# Altium footprint library Package_SO.PcbLib: 333 footprints (part 14 of 21)
Each footprint in its own frame and in the unit in brackets; x right, y up, seen from the top. Pads: shape width x height; smd on the part's side, far side on the other; paste and mask are expansions set on the pad; w line width, h text height; cw(c..) or ccw(c..) is an arc to the next point about the centre after c.
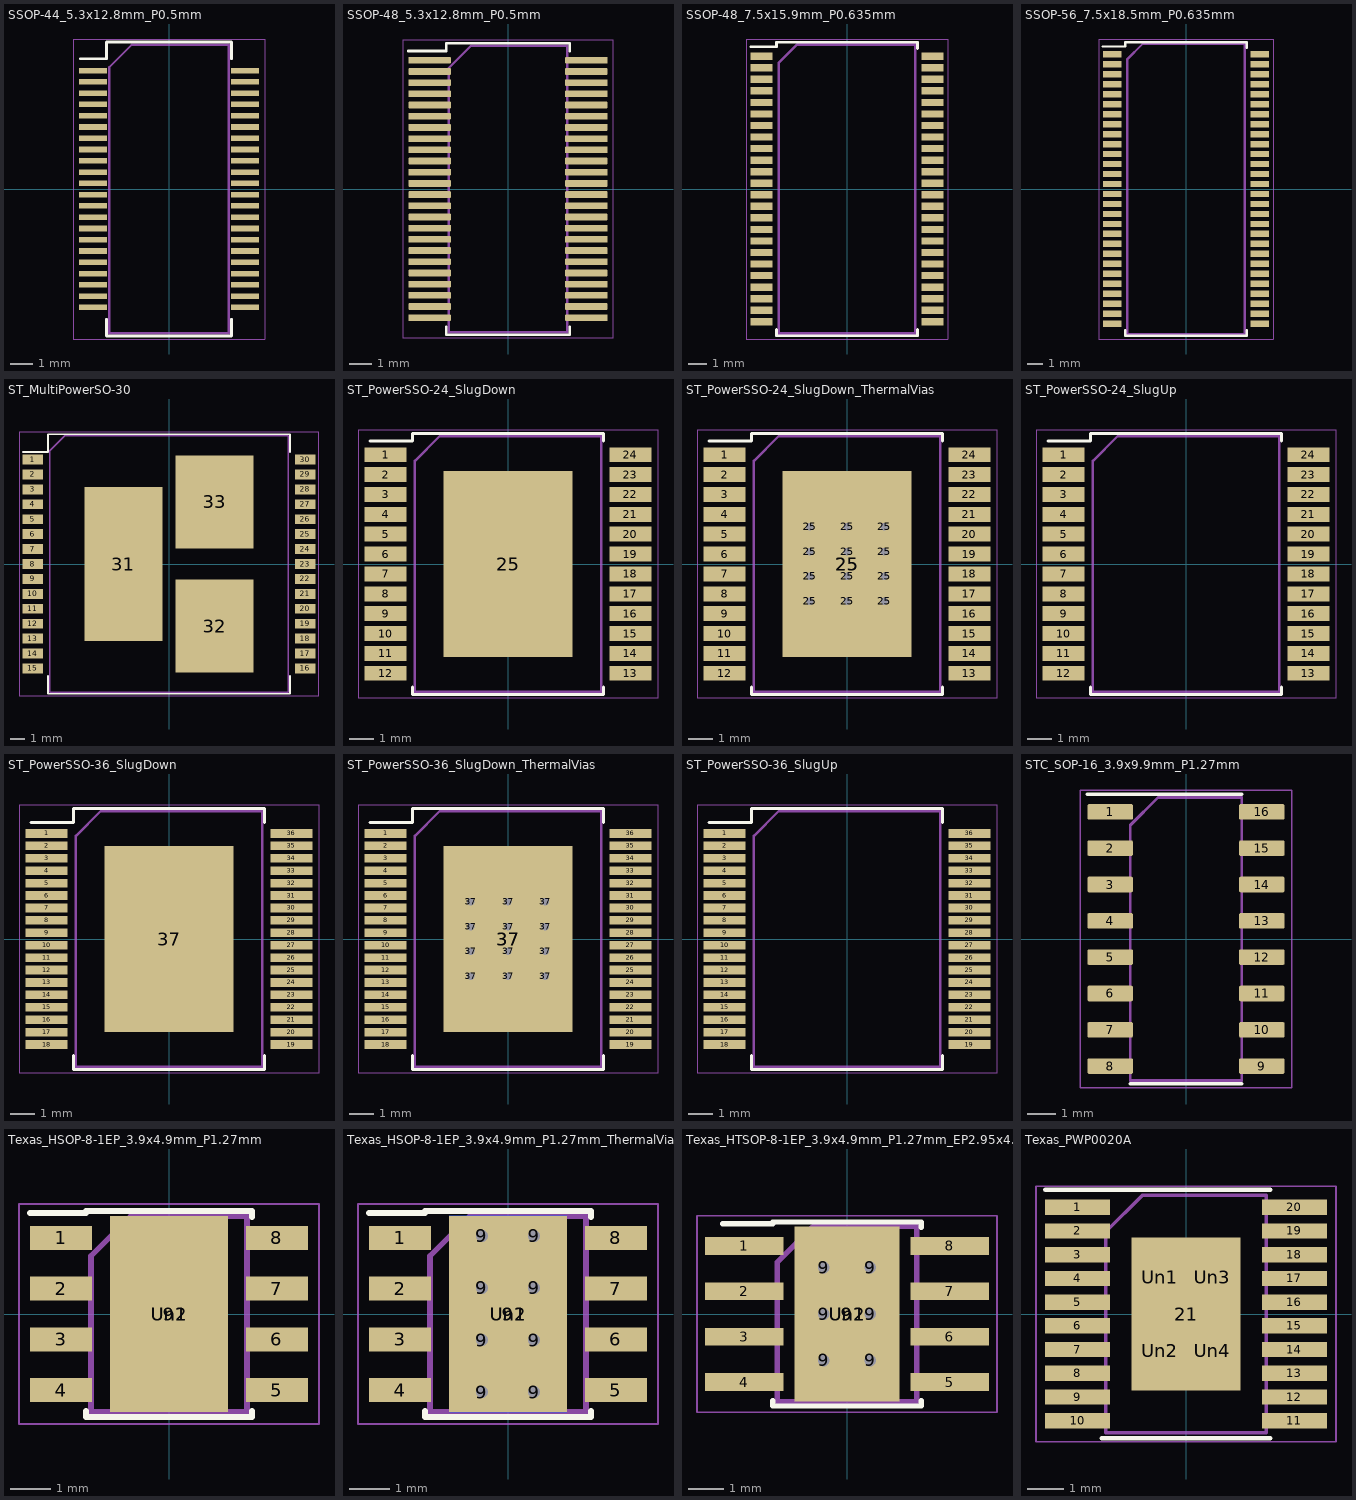
[diagram p13: the footprints below, top view; thin cyan lines are the x and y axes]

## SSOP-44_5.3x12.8mm_P0.5mm [mm]
pads (44):
  rect 1.25x0.25 smd: 1(-3.375,5.25) 2(-3.375,4.75) 3(-3.375,4.25) 4(-3.375,3.75) 5(-3.375,3.25) 6(-3.375,2.75) 7(-3.375,2.25) 8(-3.375,1.75) 9(-3.375,1.25) 10(-3.375,0.75) 11(-3.375,0.25) 12(-3.375,-0.25) 13(-3.375,-0.75) 14(-3.375,-1.25) 15(-3.375,-1.75) 16(-3.375,-2.25) 17(-3.375,-2.75) 18(-3.375,-3.25) 19(-3.375,-3.75) 20(-3.375,-4.25) 21(-3.375,-4.75) 22(-3.375,-5.25) 23(3.375,-5.25) 24(3.375,-4.75) 25(3.375,-4.25) 26(3.375,-3.75) 27(3.375,-3.25) 28(3.375,-2.75) 29(3.375,-2.25) 30(3.375,-1.75) 31(3.375,-1.25) 32(3.375,-0.75) 33(3.375,-0.25) 34(3.375,0.25) 35(3.375,0.75) 36(3.375,1.25) 37(3.375,1.75) 38(3.375,2.25) 39(3.375,2.75) 40(3.375,3.25) 41(3.375,3.75) 42(3.375,4.25) 43(3.375,4.75) 44(3.375,5.25)
F.SilkS:
  lines w0.12: -3.94,5.77 -2.77,5.77 -2.77,6.52 2.77,6.52 2.77,5.77 ; -2.77,-5.77 -2.77,-6.52 2.77,-6.52 2.77,-5.77
F.CrtYd:
  lines w0.05: -4.25,-6.65 -4.25,6.65 4.25,6.65 4.25,-6.65 -4.25,-6.65
F.Fab:
  lines w0.1: -2.65,-6.4 2.65,-6.4 2.65,6.4 -1.65,6.4 -2.65,5.4 -2.65,-6.4
  text "'.Designator'" at -4.047,-0.84 h1

## SSOP-48_5.3x12.8mm_P0.5mm [mm]
pads (48):
  rrect25% 1.9x0.3 smd: 1(-3.5,5.75) 2(-3.5,5.25) 3(-3.5,4.75) 4(-3.5,4.25) 5(-3.5,3.75) 6(-3.5,3.25) 7(-3.5,2.75) 8(-3.5,2.25) 9(-3.5,1.75) 10(-3.5,1.25) 11(-3.5,0.75) 12(-3.5,0.25) 13(-3.5,-0.25) 14(-3.5,-0.75) 15(-3.5,-1.25) 16(-3.5,-1.75) 17(-3.5,-2.25) 18(-3.5,-2.75) 19(-3.5,-3.25) 20(-3.5,-3.75) 21(-3.5,-4.25) 22(-3.5,-4.75) 23(-3.5,-5.25) 24(-3.5,-5.75) 25(3.5,-5.75) 26(3.5,-5.25) 27(3.5,-4.75) 28(3.5,-4.25) 29(3.5,-3.75) 30(3.5,-3.25) 31(3.5,-2.75) 32(3.5,-2.25) 33(3.5,-1.75) 34(3.5,-1.25) 35(3.5,-0.75) 36(3.5,-0.25) 37(3.5,0.25) 38(3.5,0.75) 39(3.5,1.25) 40(3.5,1.75) 41(3.5,2.25) 42(3.5,2.75) 43(3.5,3.25) 44(3.5,3.75) 45(3.5,4.25) 46(3.5,4.75) 47(3.5,5.25) 48(3.5,5.75)
F.SilkS:
  lines w0.12: -4.45,6.16 -2.76,6.16 -2.76,6.51 0,6.51 2.76,6.51 2.76,6.16 ; -2.76,-6.16 -2.76,-6.51 0,-6.51 2.76,-6.51 2.76,-6.16
F.CrtYd:
  lines w0.05: -4.7,-6.65 -4.7,6.65 4.7,6.65 4.7,-6.65 -4.7,-6.65
F.Fab:
  lines w0.1: -2.65,-6.4 -2.65,5.4 -1.65,6.4 2.65,6.4 2.65,-6.4 -2.65,-6.4
  text "'.Designator'" at -4.047,-0.84 h1

## SSOP-48_7.5x15.9mm_P0.635mm [mm]
pads (48):
  rect 1.2x0.4 smd: 1(-4.7,7.302) 2(-4.7,6.667) 3(-4.7,6.032) 4(-4.7,5.397) 5(-4.7,4.763) 6(-4.7,4.127) 7(-4.7,3.492) 8(-4.7,2.857) 9(-4.7,2.222) 10(-4.7,1.587) 11(-4.7,0.953) 12(-4.7,0.318) 13(-4.7,-0.318) 14(-4.7,-0.953) 15(-4.7,-1.587) 16(-4.7,-2.222) 17(-4.7,-2.857) 18(-4.7,-3.492) 19(-4.7,-4.127) 20(-4.7,-4.763) 21(-4.7,-5.397) 22(-4.7,-6.032) 23(-4.7,-6.667) 24(-4.7,-7.302) 25(4.7,-7.302) 26(4.7,-6.667) 27(4.7,-6.032) 28(4.7,-5.397) 29(4.7,-4.763) 30(4.7,-4.127) 31(4.7,-3.492) 32(4.7,-2.857) 33(4.7,-2.222) 34(4.7,-1.587) 35(4.7,-0.953) 36(4.7,-0.318) 37(4.7,0.318) 38(4.7,0.953) 39(4.7,1.587) 40(4.7,2.222) 41(4.7,2.857) 42(4.7,3.492) 43(4.7,4.127) 44(4.7,4.763) 45(4.7,5.397) 46(4.7,6.032) 47(4.7,6.667) 48(4.7,7.302)
F.SilkS:
  lines w0.15: -5.3,7.825 -3.875,7.825 -3.875,8.075 3.875,8.075 3.875,7.728 ; -3.875,-7.728 -3.875,-8.075 3.875,-8.075 3.875,-7.728
F.CrtYd:
  lines w0.05: -5.55,-8.25 -5.55,8.25 5.55,8.25 5.55,-8.25 -5.55,-8.25
F.Fab:
  lines w0.15: -3.75,-7.95 3.75,-7.95 3.75,7.95 -2.75,7.95 -3.75,6.95 -3.75,-7.95
  text "'.Designator'" at -3.267,-0.702 h0.8

## SSOP-56_7.5x18.5mm_P0.635mm [mm]
pads (56):
  rect 1.2x0.4 smd: 1(-4.7,8.572) 2(-4.7,7.938) 3(-4.7,7.302) 4(-4.7,6.667) 5(-4.7,6.032) 6(-4.7,5.397) 7(-4.7,4.763) 8(-4.7,4.127) 9(-4.7,3.492) 10(-4.7,2.857) 11(-4.7,2.222) 12(-4.7,1.587) 13(-4.7,0.953) 14(-4.7,0.318) 15(-4.7,-0.318) 16(-4.7,-0.953) 17(-4.7,-1.587) 18(-4.7,-2.222) 19(-4.7,-2.857) 20(-4.7,-3.492) 21(-4.7,-4.127) 22(-4.7,-4.763) 23(-4.7,-5.397) 24(-4.7,-6.032) 25(-4.7,-6.667) 26(-4.7,-7.302) 27(-4.7,-7.938) 28(-4.7,-8.572) 29(4.7,-8.572) 30(4.7,-7.938) 31(4.7,-7.302) 32(4.7,-6.667) 33(4.7,-6.032) 34(4.7,-5.397) 35(4.7,-4.763) 36(4.7,-4.127) 37(4.7,-3.492) 38(4.7,-2.857) 39(4.7,-2.222) 40(4.7,-1.587) 41(4.7,-0.953) 42(4.7,-0.318) 43(4.7,0.318) 44(4.7,0.953) 45(4.7,1.587) 46(4.7,2.222) 47(4.7,2.857) 48(4.7,3.492) 49(4.7,4.127) 50(4.7,4.763) 51(4.7,5.397) 52(4.7,6.032) 53(4.7,6.667) 54(4.7,7.302) 55(4.7,7.938) 56(4.7,8.572)
F.SilkS:
  lines w0.15: -5.3,9.075 -3.875,9.075 -3.875,9.35 3.875,9.35 3.875,8.998 ; -3.875,-8.998 -3.875,-9.35 3.875,-9.35 3.875,-8.998
F.CrtYd:
  lines w0.05: -5.55,-9.55 -5.55,9.55 5.55,9.55 5.55,-9.55 -5.55,-9.55
F.Fab:
  lines w0.15: -3.75,-9.25 3.75,-9.25 3.75,9.25 -2.75,9.25 -3.75,8.25 -3.75,-9.25
  text "'.Designator'" at -3.267,-0.702 h0.8

## ST_MultiPowerSO-30 [mm]
pads (33):
  rect 1.35x0.66 smd: 1(-9.125,7) 2(-9.125,6) 3(-9.125,5) 4(-9.125,4) 5(-9.125,3) 6(-9.125,2) 7(-9.125,1) 8(-9.125,0) 9(-9.125,-1) 10(-9.125,-2) 11(-9.125,-3) 12(-9.125,-4) 13(-9.125,-5) 14(-9.125,-6) 15(-9.125,-7) 16(9.125,-7) 17(9.125,-6) 18(9.125,-5) 19(9.125,-4) 20(9.125,-3) 21(9.125,-2) 22(9.125,-1) 23(9.125,0) 24(9.125,1) 25(9.125,2) 26(9.125,3) 27(9.125,4) 28(9.125,5) 29(9.125,6) 30(9.125,7)
  rect 5.25x10.3 smd: 31(-3.05,0)
  rect 5.25x6.23 smd: 32(3.05,-4.165) 33(3.05,4.165)
F.SilkS:
  lines w0.12: -9.8,7.5 -8.1,7.5 -8.1,8.7 -8,8.7 8,8.7 8.1,8.7 8.1,7.5 ; -8.1,-7.5 -8.1,-8.7 8,-8.7 8.1,-8.7 8.1,-7.5
F.CrtYd:
  lines w0.05: -10.05,-8.85 -10.05,8.85 10.05,8.85 10.05,-8.85 -10.05,-8.85
F.Fab:
  lines w0.1: -8,-8.6 8,-8.6 8,8.6 -7,8.6 -8,7.6 -8,-8.6
  text "'.Designator'" at -4.047,-0.84 h1

## ST_PowerSSO-24_SlugDown [mm]
pads (25):
  rect 1.7x0.6 smd: 1(-4.932,4.4) 2(-4.932,3.6) 3(-4.932,2.8) 4(-4.932,2) 5(-4.932,1.2) 6(-4.932,0.4) 7(-4.932,-0.4) 8(-4.932,-1.2) 9(-4.932,-2) 10(-4.932,-2.8) 11(-4.932,-3.6) 12(-4.932,-4.4) 13(4.932,-4.4) 14(4.932,-3.6) 15(4.932,-2.8) 16(4.932,-2) 17(4.932,-1.2) 18(4.932,-0.4) 19(4.932,0.4) 20(4.932,1.2) 21(4.932,2) 22(4.932,2.8) 23(4.932,3.6) 24(4.932,4.4)
  rect 5.2x7.5 smd: 25(0,0)
F.SilkS:
  lines w0.12: -5.55,4.95 -3.85,4.95 -3.85,5.25 ; -3.85,-4.95 -3.85,-5.25 3.85,-5.25 ; -3.75,5.25 -3.85,5.25 ; 3.75,-5.25 3.85,-5.25 ; 3.75,5.25 3.85,5.25 ; 3.85,-4.95 3.85,-5.25 ; 3.85,4.95 3.85,5.25 ; -3.85,5.25 3.85,5.25
F.CrtYd:
  lines w0.05: -6.04,-5.4 6.04,-5.4 6.04,5.4 -6.04,5.4 -6.04,-5.4
F.Fab:
  lines w0.1: -3.75,-5.15 3.75,-5.15 3.75,5.15 -2.75,5.15 -3.75,4.15 -3.75,-5.15
  text "'.Designator'" at -4.047,-0.84 h1

## ST_PowerSSO-24_SlugDown_ThermalVias [mm]
pads (38):
  rect 1.7x0.6 smd: 1(-4.932,4.4) 2(-4.932,3.6) 3(-4.932,2.8) 4(-4.932,2) 5(-4.932,1.2) 6(-4.932,0.4) 7(-4.932,-0.4) 8(-4.932,-1.2) 9(-4.932,-2) 10(-4.932,-2.8) 11(-4.932,-3.6) 12(-4.932,-4.4) 13(4.932,-4.4) 14(4.932,-3.6) 15(4.932,-2.8) 16(4.932,-2) 17(4.932,-1.2) 18(4.932,-0.4) 19(4.932,0.4) 20(4.932,1.2) 21(4.932,2) 22(4.932,2.8) 23(4.932,3.6) 24(4.932,4.4)
  round 0.7 hole 0.3: 25(-1.5,-1.5) 25(-1.5,-0.5) 25(-1.5,0.5) 25(-1.5,1.5) 25(0,-1.5) 25(0,-0.5) 25(0,0.5) 25(0,1.5) 25(1.5,-1.5) 25(1.5,-0.5) 25(1.5,0.5) 25(1.5,1.5)
  rect 5.2x7.5 smd: 25(0,0)
  rect 4.3x4.3 smd far side: 25(0,0)
F.SilkS:
  lines w0.12: -5.55,4.95 -3.85,4.95 -3.85,5.25 ; -3.85,-4.95 -3.85,-5.25 3.85,-5.25 ; -3.75,5.25 -3.85,5.25 ; 3.75,-5.25 3.85,-5.25 ; 3.75,5.25 3.85,5.25 ; 3.85,-4.95 3.85,-5.25 ; 3.85,4.95 3.85,5.25 ; -3.85,5.25 3.85,5.25
F.CrtYd:
  lines w0.05: -6.04,-5.4 6.04,-5.4 6.04,5.4 -6.04,5.4 -6.04,-5.4
F.Fab:
  lines w0.1: -3.75,-5.15 3.75,-5.15 3.75,5.15 -2.75,5.15 -3.75,4.15 -3.75,-5.15
  text "'.Designator'" at -4.047,-0.84 h1

## ST_PowerSSO-24_SlugUp [mm]
pads (24):
  rect 1.7x0.6 smd: 1(-4.932,4.4) 2(-4.932,3.6) 3(-4.932,2.8) 4(-4.932,2) 5(-4.932,1.2) 6(-4.932,0.4) 7(-4.932,-0.4) 8(-4.932,-1.2) 9(-4.932,-2) 10(-4.932,-2.8) 11(-4.932,-3.6) 12(-4.932,-4.4) 13(4.932,-4.4) 14(4.932,-3.6) 15(4.932,-2.8) 16(4.932,-2) 17(4.932,-1.2) 18(4.932,-0.4) 19(4.932,0.4) 20(4.932,1.2) 21(4.932,2) 22(4.932,2.8) 23(4.932,3.6) 24(4.932,4.4)
F.SilkS:
  lines w0.12: -5.55,4.95 -3.85,4.95 -3.85,5.25 ; -3.85,-4.95 -3.85,-5.25 3.85,-5.25 ; -3.75,5.25 -3.85,5.25 ; 3.75,-5.25 3.85,-5.25 ; 3.75,5.25 3.85,5.25 ; 3.85,-4.95 3.85,-5.25 ; 3.85,4.95 3.85,5.25 ; -3.85,5.25 3.85,5.25
F.CrtYd:
  lines w0.05: -6.04,-5.4 -6.04,5.4 6.04,5.4 6.04,-5.4 -6.04,-5.4
F.Fab:
  lines w0.1: -3.75,-5.15 3.75,-5.15 3.75,5.15 -2.75,5.15 -3.75,4.15 -3.75,-5.15
  text "'.Designator'" at -4.047,-0.84 h1

## ST_PowerSSO-36_SlugDown [mm]
pads (37):
  rect 1.7x0.35 smd: 1(-4.932,4.25) 2(-4.932,3.75) 3(-4.932,3.25) 4(-4.932,2.75) 5(-4.932,2.25) 6(-4.932,1.75) 7(-4.932,1.25) 8(-4.932,0.75) 9(-4.932,0.25) 10(-4.932,-0.25) 11(-4.932,-0.75) 12(-4.932,-1.25) 13(-4.932,-1.75) 14(-4.932,-2.25) 15(-4.932,-2.75) 16(-4.932,-3.25) 17(-4.932,-3.75) 18(-4.932,-4.25) 19(4.932,-4.25) 20(4.932,-3.75) 21(4.932,-3.25) 22(4.932,-2.75) 23(4.932,-2.25) 24(4.932,-1.75) 25(4.932,-1.25) 26(4.932,-0.75) 27(4.932,-0.25) 28(4.932,0.25) 29(4.932,0.75) 30(4.932,1.25) 31(4.932,1.75) 32(4.932,2.25) 33(4.932,2.75) 34(4.932,3.25) 35(4.932,3.75) 36(4.932,4.25)
  rect 5.2x7.5 smd: 37(0,0)
F.SilkS:
  lines w0.12: -5.55,4.7 -3.85,4.7 -3.85,5.25 ; -3.85,-4.7 -3.85,-5.25 3.85,-5.25 ; -3.75,5.25 -3.85,5.25 ; 3.75,-5.25 3.85,-5.25 ; 3.75,5.25 3.85,5.25 ; 3.85,-4.7 3.85,-5.25 ; 3.85,4.7 3.85,5.25 ; -3.85,5.25 3.85,5.25
F.CrtYd:
  lines w0.05: -6.04,-5.4 6.04,-5.4 6.04,5.4 -6.04,5.4 -6.04,-5.4
F.Fab:
  lines w0.1: -3.75,-5.15 -3.75,4.15 -2.75,5.15 3.75,5.15 3.75,-5.15 -3.75,-5.15
  text "'.Designator'" at -4.047,-0.84 h1

## ST_PowerSSO-36_SlugDown_ThermalVias [mm]
pads (50):
  rect 1.7x0.35 smd: 1(-4.932,4.25) 2(-4.932,3.75) 3(-4.932,3.25) 4(-4.932,2.75) 5(-4.932,2.25) 6(-4.932,1.75) 7(-4.932,1.25) 8(-4.932,0.75) 9(-4.932,0.25) 10(-4.932,-0.25) 11(-4.932,-0.75) 12(-4.932,-1.25) 13(-4.932,-1.75) 14(-4.932,-2.25) 15(-4.932,-2.75) 16(-4.932,-3.25) 17(-4.932,-3.75) 18(-4.932,-4.25) 19(4.932,-4.25) 20(4.932,-3.75) 21(4.932,-3.25) 22(4.932,-2.75) 23(4.932,-2.25) 24(4.932,-1.75) 25(4.932,-1.25) 26(4.932,-0.75) 27(4.932,-0.25) 28(4.932,0.25) 29(4.932,0.75) 30(4.932,1.25) 31(4.932,1.75) 32(4.932,2.25) 33(4.932,2.75) 34(4.932,3.25) 35(4.932,3.75) 36(4.932,4.25)
  round 0.6 hole 0.3: 37(-1.5,-1.5) 37(-1.5,-0.5) 37(-1.5,0.5) 37(-1.5,1.5) 37(0,-1.5) 37(0,-0.5) 37(0,0.5) 37(0,1.5) 37(1.5,-1.5) 37(1.5,-0.5) 37(1.5,0.5) 37(1.5,1.5)
  rect 4.3x4.3 smd far side: 37(0,0)
  rect 5.2x7.5 smd: 37(0,0)
F.SilkS:
  lines w0.12: -5.55,4.7 -3.85,4.7 -3.85,5.25 ; -3.85,-4.7 -3.85,-5.25 3.85,-5.25 ; -3.75,5.25 -3.85,5.25 ; 3.75,-5.25 3.85,-5.25 ; 3.75,5.25 3.85,5.25 ; 3.85,-4.7 3.85,-5.25 ; 3.85,4.7 3.85,5.25 ; -3.85,5.25 3.85,5.25
F.CrtYd:
  lines w0.05: -6.04,-5.4 -6.04,5.4 6.04,5.4 6.04,-5.4 -6.04,-5.4
F.Fab:
  lines w0.1: -3.75,-5.15 -3.75,4.15 -2.75,5.15 3.75,5.15 3.75,-5.15 -3.75,-5.15
  text "'.Designator'" at -4.047,-0.84 h1

## ST_PowerSSO-36_SlugUp [mm]
pads (36):
  rect 1.7x0.35 smd: 1(-4.932,4.25) 2(-4.932,3.75) 3(-4.932,3.25) 4(-4.932,2.75) 5(-4.932,2.25) 6(-4.932,1.75) 7(-4.932,1.25) 8(-4.932,0.75) 9(-4.932,0.25) 10(-4.932,-0.25) 11(-4.932,-0.75) 12(-4.932,-1.25) 13(-4.932,-1.75) 14(-4.932,-2.25) 15(-4.932,-2.75) 16(-4.932,-3.25) 17(-4.932,-3.75) 18(-4.932,-4.25) 19(4.932,-4.25) 20(4.932,-3.75) 21(4.932,-3.25) 22(4.932,-2.75) 23(4.932,-2.25) 24(4.932,-1.75) 25(4.932,-1.25) 26(4.932,-0.75) 27(4.932,-0.25) 28(4.932,0.25) 29(4.932,0.75) 30(4.932,1.25) 31(4.932,1.75) 32(4.932,2.25) 33(4.932,2.75) 34(4.932,3.25) 35(4.932,3.75) 36(4.932,4.25)
F.SilkS:
  lines w0.12: -5.55,4.7 -3.85,4.7 -3.85,5.25 ; -3.85,-4.7 -3.85,-5.25 3.85,-5.25 ; -3.75,5.25 -3.85,5.25 ; 3.75,-5.25 3.85,-5.25 ; 3.75,5.25 3.85,5.25 ; 3.85,-4.7 3.85,-5.25 ; 3.85,4.7 3.85,5.25 ; -3.85,5.25 3.85,5.25
F.CrtYd:
  lines w0.05: -6.04,-5.4 -6.04,5.4 6.04,5.4 6.04,-5.4 -6.04,-5.4
F.Fab:
  lines w0.1: -3.75,-5.15 -3.75,4.15 -2.75,5.15 3.75,5.15 3.75,-5.15 -3.75,-5.15
  text "'.Designator'" at -4.047,-0.84 h1

## STC_SOP-16_3.9x9.9mm_P1.27mm [mm]
pads (16):
  rrect25% 1.6x0.55 smd: 1(-2.65,4.445) 2(-2.65,3.175) 3(-2.65,1.905) 4(-2.65,0.635) 5(-2.65,-0.635) 6(-2.65,-1.905) 7(-2.65,-3.175) 8(-2.65,-4.445) 9(2.65,-4.445) 10(2.65,-3.175) 11(2.65,-1.905) 12(2.65,-0.635) 13(2.65,0.635) 14(2.65,1.905) 15(2.65,3.175) 16(2.65,4.445)
F.SilkS:
  lines w0.12: -3.45,5.06 0,5.06 1.95,5.06 ; -1.95,-5.06 0,-5.06 1.95,-5.06
F.CrtYd:
  lines w0.05: -3.7,-5.2 -3.7,5.2 3.7,5.2 3.7,-5.2 -3.7,-5.2
F.Fab:
  lines w0.1: -1.95,-4.95 -1.95,3.975 -0.975,4.95 1.95,4.95 1.95,-4.95 -1.95,-4.95
  text "'.Designator'" at -3.969,-0.827 h0.98

## Texas_HSOP-8-1EP_3.9x4.9mm_P1.27mm [mm]
pads (11):
  rect 1.55x0.6 smd: 1(-2.7,1.905) 2(-2.7,0.635) 3(-2.7,-0.635) 4(-2.7,-1.905) 5(2.7,-1.905) 6(2.7,-0.635) 7(2.7,0.635) 8(2.7,1.905)
  rect 2.95x4.9 smd: 9(0,0)
  rect 2.6x3.1 on Top Paste: Un1(0,0)
  rect 2.6x3.1 on Top Solder: Un2(0,0)
F.SilkS:
  lines w0.15: -3.475,2.525 -2.075,2.525 -2.075,2.575 2.075,2.575 2.075,2.43 ; -2.075,-2.43 -2.075,-2.575 2.075,-2.575 2.075,-2.43
F.CrtYd:
  lines w0.05: -3.75,-2.75 3.75,-2.75 3.75,2.75 -3.75,2.75 -3.75,-2.75
F.Fab:
  lines w0.15: -1.95,-2.45 -1.95,1.45 -0.95,2.45 1.95,2.45 1.95,-2.45 -1.95,-2.45
  text "'.Designator'" at -3.642,-0.756 h0.9

## Texas_HSOP-8-1EP_3.9x4.9mm_P1.27mm_ThermalVias [mm]
pads (20):
  rect 1.55x0.6 smd: 1(-2.7,1.905) 2(-2.7,0.635) 3(-2.7,-0.635) 4(-2.7,-1.905) 5(2.7,-1.905) 6(2.7,-0.635) 7(2.7,0.635) 8(2.7,1.905)
  round 0.6 hole 0.3: 9(-0.65,-1.95) 9(-0.65,-0.65) 9(-0.65,0.65) 9(-0.65,1.95) 9(0.65,-1.95) 9(0.65,-0.65) 9(0.65,0.65) 9(0.65,1.95)
  rect 2.95x4.9 smd far side: 9(0,0)
  rect 2.95x4.9 smd: 9(0,0)
  rect 2.6x3.1 on Top Paste: Un1(0,0)
  rect 2.6x3.1 on Top Solder: Un2(0,0)
F.SilkS:
  lines w0.15: -3.475,2.525 -2.075,2.525 -2.075,2.575 2.075,2.575 2.075,2.43 ; -2.075,-2.43 -2.075,-2.575 2.075,-2.575 2.075,-2.43
F.CrtYd:
  lines w0.05: -3.75,-2.75 3.75,-2.75 3.75,2.75 -3.75,2.75 -3.75,-2.75
F.Fab:
  lines w0.15: -1.95,-2.45 1.95,-2.45 1.95,2.45 -0.95,2.45 -1.95,1.45 -1.95,-2.45
  text "'.Designator'" at -3.642,-0.756 h0.9

## Texas_HTSOP-8-1EP_3.9x4.9mm_P1.27mm_EP2.95x4.9mm_Mask2.4x3.1mm_ThermalVias [mm]
pads (18):
  rect 2.2x0.5 smd: 1(-2.875,1.905) 2(-2.875,0.635) 3(-2.875,-0.635) 4(-2.875,-1.905) 5(2.875,-1.905) 6(2.875,-0.635) 7(2.875,0.635) 8(2.875,1.905)
  round 0.63 hole 0.33: 9(-0.65,-1.3) 9(-0.65,0) 9(-0.65,1.3) 9(0.65,-1.3) 9(0.65,0) 9(0.65,1.3)
  rect 2.6x3.3 smd far side: 9(0,0)
  rect 2.95x4.9 smd: 9(0,0)
  rect 2.4x3.1 on Top Paste: Un1(0,0)
  rect 2.4x3.1 on Top Solder: Un2(0,0)
F.SilkS:
  lines w0.15: -3.475,2.525 -2.075,2.525 -2.075,2.575 2.075,2.575 2.075,2.43 ; -2.075,-2.43 -2.075,-2.575 2.075,-2.575 2.075,-2.43
F.CrtYd:
  lines w0.05: -4.2,-2.75 -4.2,2.75 4.2,2.75 4.2,-2.75 -4.2,-2.75
F.Fab:
  lines w0.15: -1.95,-2.45 1.95,-2.45 1.95,2.45 -0.95,2.45 -1.95,1.45 -1.95,-2.45
  text "'.Designator'" at -3.642,-0.756 h0.9

## Texas_PWP0020A [mm]
pads (25):
  rect 1.78x0.42 smd: 1(-2.97,2.925) 2(-2.97,2.275) 3(-2.97,1.625) 4(-2.97,0.975) 5(-2.97,0.325) 6(-2.97,-0.325) 7(-2.97,-0.975) 8(-2.97,-1.625) 9(-2.97,-2.275) 10(-2.97,-2.925) 11(2.97,-2.925) 12(2.97,-2.275) 13(2.97,-1.625) 14(2.97,-0.975) 15(2.97,-0.325) 16(2.97,0.325) 17(2.97,0.975) 18(2.97,1.625) 19(2.97,2.275) 20(2.97,2.925)
  rect 3x4.2 smd: 21(0,0)
  rect 1.275x1.875 on Top Paste: Un1(-0.713,1.012) Un2(-0.713,-1.012) Un3(0.713,1.012) Un4(0.713,-1.012)
F.SilkS:
  lines w0.12: -3.86,3.4 2.31,3.4 ; -2.31,-3.4 2.31,-3.4
F.CrtYd:
  lines w0.05: -4.11,-3.5 -4.11,3.5 4.11,3.5 4.11,-3.5 -4.11,-3.5
F.Fab:
  lines w0.1: -2.2,-3.25 2.2,-3.25 2.2,3.25 -1.2,3.25 -2.2,2.25 -2.2,-3.25
  text "'.Designator'" at -4.047,-0.84 h1